# Altium footprint library Watch Max.PcbLib: 66 footprints (part 1 of 5)
Each footprint in its own frame and in the unit in brackets; x right, y up, seen from the top. Pads: shape width x height; smd on the part's side, far side on the other; paste and mask are expansions set on the pad; w line width, h text height; cw(c..) or ccw(c..) is an arc to the next point about the centre after c.
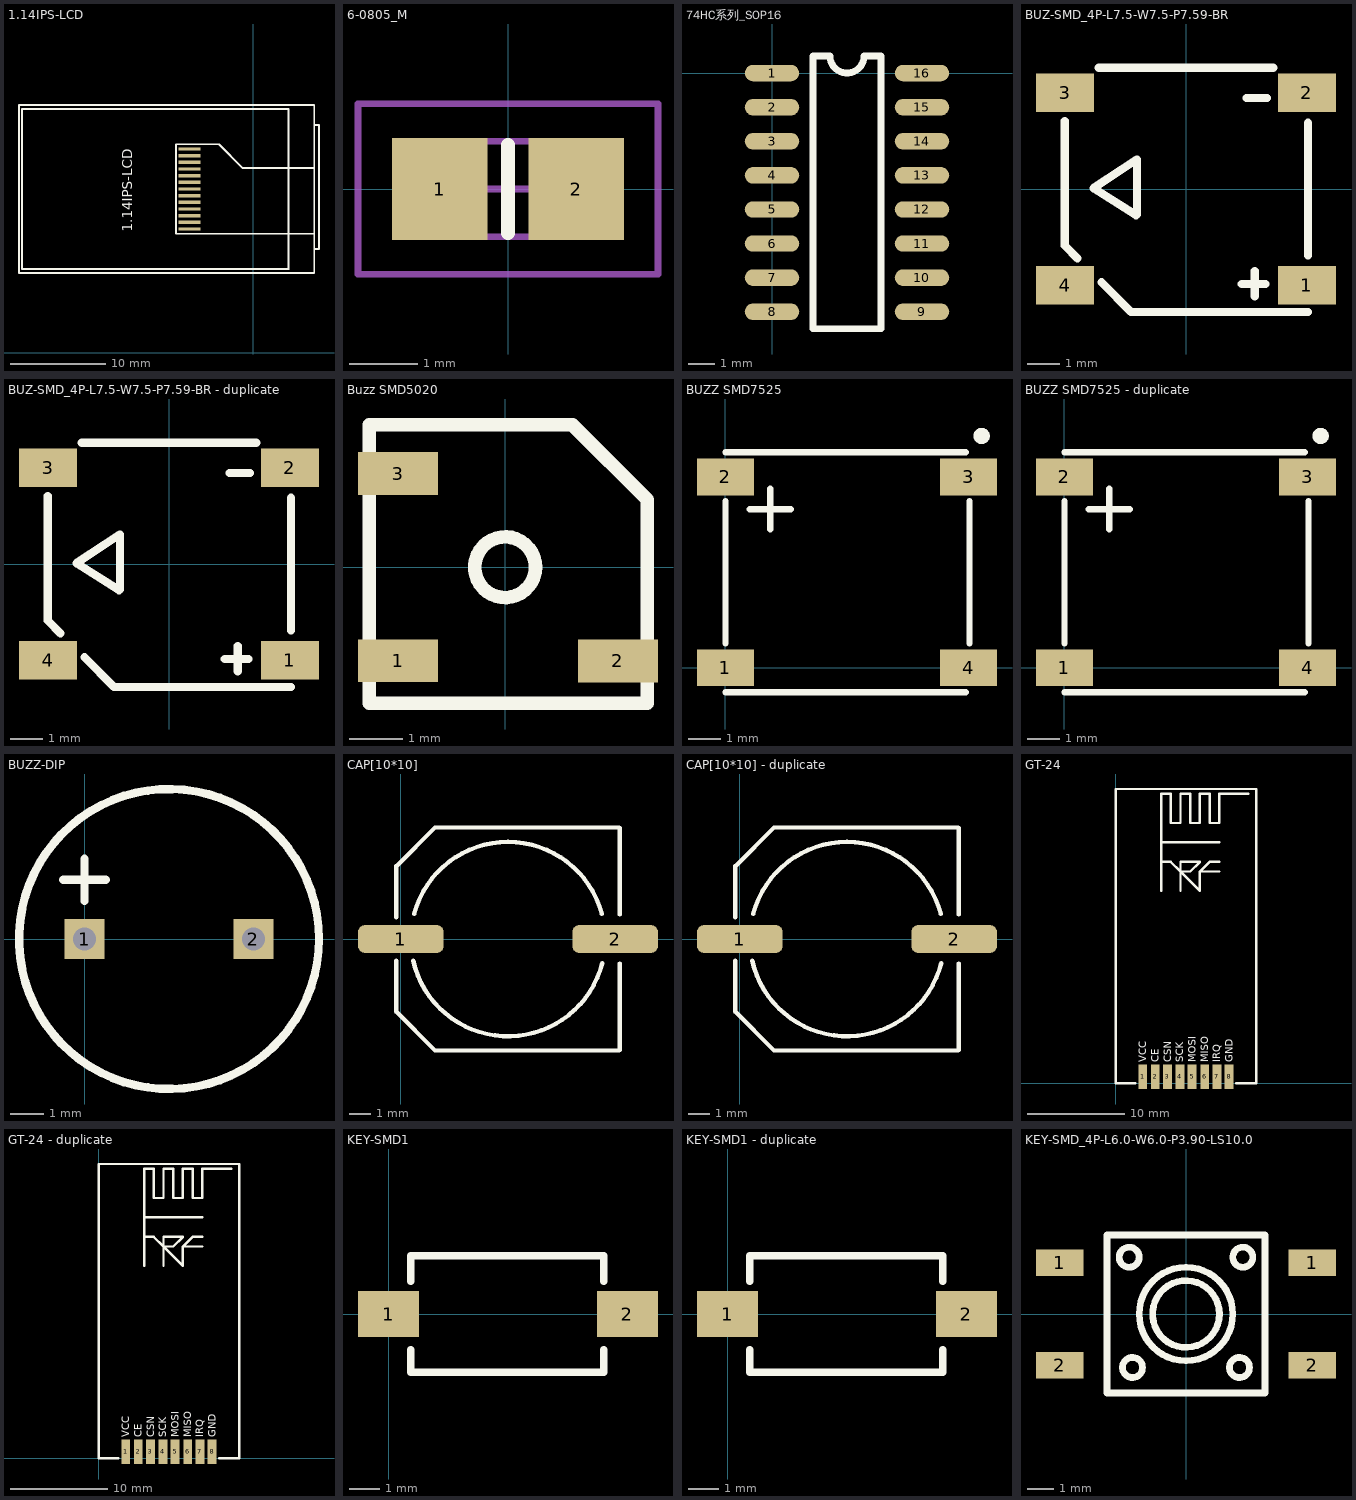
[diagram p0: the footprints below, top view; thin cyan lines are the x and y axes]

## 1.14IPS-LCD [mm] "1.14寸IPS-LCD裸屏SPI接口"
pads (13):
  rect 2.3x0.35 smd: 1(-6.7,21.4) 2(-6.7,20.7) 3(-6.7,20) 4(-6.7,19.3) 5(-6.7,18.6) 6(-6.7,17.9) 7(-6.7,17.2) 8(-6.7,16.5) 9(-6.7,15.8) 10(-6.7,15.1) 11(-6.7,14.4) 12(-6.7,13.7) 13(-6.7,13)
Top Overlay:
  lines w0.203: 6.4,10.9 6.9,10.9 6.9,23.9 6.4,23.9 ; -24.6,8.4 -24.6,26 6.4,26 6.4,8.4 -24.6,8.4 ; -24.31,8.8 -24.3,8.81 -24.3,25.6 3.71,25.6 3.71,8.81 3.7,8.8 -24.31,8.8 ; -8.1,12.5 -8.1,21.9 -3.6,21.9 -1.1,19.4 6.4,19.4 6.4,12.5 -8.1,12.5
  text "1.14IPS-LCD" at -12.7,12.7 h1.02

## 6-0805_M [mm] "Chip Resistor, Body 2.0x1.2mm, IPC Low Density"
height 0.7
pads (2):
  rect 1.4x1.5 smd: 1(-1,0) 2(1,0)
Top Overlay:
  lines w0.2: 0,-0.65 0,0.65
Mechanical 13:
  lines w0.1: -1.075,-0.7 -1.075,0.7 1.075,0.7 1.075,-0.7 -1.075,-0.7
Mechanical 15:
  lines w0.1: -0.5,0 0.5,0 ; 0,-0.5 0,0.5 ; -2.2,-1.25 -2.2,1.25 2.2,1.25 2.2,-1.25 -2.2,-1.25
3D body: height 0.7, standoff 0, extent -1.075,-0.7 1.075,0.7

## 74HC系列_SOP16 [mil]
pads (16):
  oval 80x24 smd: 1(0,0) 2(0,-50) 3(0,-100) 4(0,-150) 5(0,-200) 6(0,-250) 7(0,-300) 8(0,-350) 9(220,-350) 10(220,-300) 11(220,-250) 12(220,-200) 13(220,-150) 14(220,-100) 15(220,-50) 16(220,0)
Top Overlay:
  lines w10: 60,-375 160,-375 160,25 135,25 cw(c110,25) 85,25 60,25 60,-375
3D body "User Library-SOIC-16-1.STEP": height 55.12, standoff 0, extent -8.11,-369.88 228.11,19.89

## BUZ-SMD_4P-L7.5-W7.5-P7.59-BR [mm]
pads (4):
  rect 1.801x1.199 smd: 1(3.75,-2.979) 2(3.75,2.98) 3(-3.75,2.98)
  rect 1.8x1.2 smd: 4(-3.75,-2.98)
Top Overlay:
  lines w0.254: -3.759,2.108 -3.759,-1.752 -3.362,-2.149 ; -2.707,3.759 2.707,3.759 ; -2.62,-2.892 -1.702,-3.81 3.785,-3.81 ; -1.549,-0.813 -2.87,0.026 -1.524,0.915 -1.524,-0.787 ; 1.727,-2.946 2.464,-2.946 ; 1.88,2.82 2.515,2.82 ; 2.134,-3.327 2.134,-2.54 ; 3.785,-2.065 3.785,2.054

## BUZ-SMD_4P-L7.5-W7.5-P7.59-BR - duplicate [mm]
pads (4):
  rect 1.801x1.199 smd: 1(3.75,-2.979) 2(3.75,2.98) 3(-3.75,2.98)
  rect 1.8x1.2 smd: 4(-3.75,-2.98)
Top Overlay:
  lines w0.254: -3.759,2.108 -3.759,-1.752 -3.362,-2.149 ; -2.707,3.759 2.707,3.759 ; -2.62,-2.892 -1.702,-3.81 3.785,-3.81 ; -1.549,-0.813 -2.87,0.026 -1.524,0.915 -1.524,-0.787 ; 1.727,-2.946 2.464,-2.946 ; 1.88,2.82 2.515,2.82 ; 2.134,-3.327 2.134,-2.54 ; 3.785,-2.065 3.785,2.054

## Buzz SMD5020 [mm]
pads (3):
  rect 1.5x0.8 smd: 1(-2,-1.75) 2(2.108,-1.753) 3(-2,1.75)
Top Overlay:
  circle w0.254: c0,0 r0.568
  lines w0.254: -2.54,-2.54 -2.54,2.66 1.26,2.66 2.66,1.26 2.66,-2.54 -2.54,-2.54

## BUZZ SMD7525 [mm]
pads (4):
  rect 1.78x1.15 smd mask+0.102: 1(0,0) 2(0,5.96) 3(7.59,5.96) 4(7.59,0)
Top Overlay:
  circle w0.254: c8.001,7.239 r0.127
  lines w0.2: 0,-0.762 7.5,-0.762 ; 0,0.762 0,5.207 ; 0,6.731 7.5,6.731 ; 0.762,4.953 2.032,4.953 ; 1.397,4.318 1.397,5.588 ; 7.62,0.762 7.62,5.207

## BUZZ SMD7525 - duplicate [mm]
pads (4):
  rect 1.78x1.15 smd mask+0.102: 1(0,0) 2(0,5.96) 3(7.59,5.96) 4(7.59,0)
Top Overlay:
  circle w0.254: c8.001,7.239 r0.127
  lines w0.2: 0,-0.762 7.5,-0.762 ; 0,0.762 0,5.207 ; 0,6.731 7.5,6.731 ; 0.762,4.953 2.032,4.953 ; 1.397,4.318 1.397,5.588 ; 7.62,0.762 7.62,5.207

## BUZZ-DIP [mm]
pads (2):
  rect 1.2x1.2 hole 0.7: 1(0,0) 2(5.08,0)
Top Overlay:
  circle w0.254: c2.54,0 r4.51
  lines w0.254: -0.635,1.778 0.635,1.778 ; 0,1.143 0,2.413
3D body "Buzzer_Active.stp": height 9.6, standoff -2.6, extent -3.265,-5.779 8.585,6.071

## CAP[10*10] [mm]
pads (2):
  rrect50% 4x1.3 smd: 1(0,0) 2(10,0)
Top Overlay:
  lines w0.203: -0.207,-1.016 -0.207,-3.397 1.596,-5.2 10.189,-5.2 10.207,-5.182 10.207,-1.143 ; -0.207,1.016 -0.207,3.404 ; -0.191,3.413 1.596,5.2 10.189,5.2 10.207,5.182 10.207,1.143 ; 0.574,-1.012 ccw(c5,0) 9.397,-1.131 ; 0.619,1.165 cw(c5,0) 9.381,1.165
3D body "SW3dPS-capacitor size G.STEP": height 10.21, standoff -0.01, extent -0.775,-5.118 10.825,5.182

## CAP[10*10] - duplicate [mm]
pads (2):
  rrect50% 4x1.3 smd: 1(0,0) 2(10,0)
Top Overlay:
  lines w0.203: -0.207,-1.016 -0.207,-3.397 1.596,-5.2 10.189,-5.2 10.207,-5.182 10.207,-1.143 ; -0.207,1.016 -0.207,3.404 ; -0.191,3.413 1.596,5.2 10.189,5.2 10.207,5.182 10.207,1.143 ; 0.574,-1.012 ccw(c5,0) 9.397,-1.131 ; 0.619,1.165 cw(c5,0) 9.381,1.165
3D body "SW3dPS-capacitor size G.STEP": height 10.21, standoff -0.01, extent -0.775,-5.118 10.825,5.182

## GT-24 [mm]
pads (8):
  rect 0.9x2.5 smd: 1(2.79,0.635) 2(4.09,0.635) 3(5.343,0.635) 4(6.63,0.635) 5(7.875,0.635) 6(9.176,0.635) 7(10.435,0.635) 8(11.688,0.635)
Top Overlay:
  lines w0.254: 2.032,0 0,0 0,30.3 14.5,30.3 14.5,0 12.446,0 ; 4.683,19.797 4.683,23.797 ; 4.683,21.797 4.683,23.797 ; 4.683,22.797 5.683,22.797 6.683,21.797 ; 10.683,21.797 8.683,21.797 ; 10.683,22.797 9.683,22.797 8.683,21.797 ; 10.683,24.797 4.683,24.797 ; 13.683,29.797 11.683,29.797 10.683,29.797 10.683,26.797 9.683,26.797 9.683,29.797 8.683,29.797 8.683,26.797 7.683,26.797 7.683,29.797 6.683,29.797 6.683,26.797 5.683,26.797 5.683,29.797 4.683,29.797 4.683,24.797 ; 4.683,23.797 4.683,24.797 ; 6.683,21.797 8.683,19.797 8.683,21.797 ; 6.683,21.797 7.683,21.797 8.683,22.797 6.683,22.797 6.683,21.797 ; 6.683,21.797 6.683,19.797 6.683,21.797
  text "VCC" at 3.175,2.159 h0.76
  text "GND" at 12.065,2.159 h0.76
  text "CE" at 4.445,2.159 h0.76
  text "CSN" at 5.715,2.159 h0.76
  text "SCK" at 6.985,2.159 h0.76
  text "MOSI" at 8.255,2.159 h0.76
  text "MISO" at 9.525,2.159 h0.76
  text "IRQ" at 10.795,2.159 h0.76

## GT-24 - duplicate [mm]
pads (8):
  rect 0.9x2.5 smd: 1(2.79,0.635) 2(4.09,0.635) 3(5.343,0.635) 4(6.63,0.635) 5(7.875,0.635) 6(9.176,0.635) 7(10.435,0.635) 8(11.688,0.635)
Top Overlay:
  lines w0.254: 2.032,0 0,0 0,30.3 14.5,30.3 14.5,0 12.446,0 ; 4.683,19.797 4.683,23.797 ; 4.683,21.797 4.683,23.797 ; 4.683,22.797 5.683,22.797 6.683,21.797 ; 10.683,21.797 8.683,21.797 ; 10.683,22.797 9.683,22.797 8.683,21.797 ; 10.683,24.797 4.683,24.797 ; 13.683,29.797 11.683,29.797 10.683,29.797 10.683,26.797 9.683,26.797 9.683,29.797 8.683,29.797 8.683,26.797 7.683,26.797 7.683,29.797 6.683,29.797 6.683,26.797 5.683,26.797 5.683,29.797 4.683,29.797 4.683,24.797 ; 4.683,23.797 4.683,24.797 ; 6.683,21.797 8.683,19.797 8.683,21.797 ; 6.683,21.797 7.683,21.797 8.683,22.797 6.683,22.797 6.683,21.797 ; 6.683,21.797 6.683,19.797 6.683,21.797
  text "VCC" at 3.175,2.159 h0.76
  text "GND" at 12.065,2.159 h0.76
  text "CE" at 4.445,2.159 h0.76
  text "CSN" at 5.715,2.159 h0.76
  text "SCK" at 6.985,2.159 h0.76
  text "MOSI" at 8.255,2.159 h0.76
  text "MISO" at 9.525,2.159 h0.76
  text "IRQ" at 10.795,2.159 h0.76

## KEY-SMD1 [mm]
pads (2):
  rect 2x1.5 smd: 1(0,0) 2(7.8,0)
Top Overlay:
  lines w0.254: 0.725,-1.168 0.725,-1.9 7.025,-1.9 7.025,-1.168 ; 0.725,1.067 0.725,1.9 7.025,1.9 7.025,1.067
3D body "SMD按键": height 2.5, standoff 0, extent -0.059,-1.945 7.831,1.905

## KEY-SMD1 - duplicate [mm]
pads (2):
  rect 2x1.5 smd: 1(0,0) 2(7.8,0)
Top Overlay:
  lines w0.254: 0.725,-1.168 0.725,-1.9 7.025,-1.9 7.025,-1.168 ; 0.725,1.067 0.725,1.9 7.025,1.9 7.025,1.067
3D body "SMD按键": height 2.5, standoff 0, extent -0.059,-1.945 7.831,1.905

## KEY-SMD_4P-L6.0-W6.0-P3.90-LS10.0 [mm]
pads (4):
  rect 1.8x1 smd: 1(-4.8,1.95) 1(4.8,1.95) 2(-4.8,-1.95) 2(4.8,-1.95)
Top Overlay:
  circle w0.254: c-2.159,2.159 r0.381
  circle w0.254: c2.159,2.159 r0.381
  circle w0.254: c-2.032,-2.032 r0.381
  circle w0.254: c2.032,-2.032 r0.381
  circle w0.254: c0,0 r1.778
  circle w0.254: c0,0 r1.27
  lines w0.254: -3,-3 -3,3 3,3 3,-3 -3,-3